# Altium footprint library MYS-Library.PcbLib: 94 footprints (part 2 of 6)
Each footprint in its own frame and in the unit in brackets; x right, y up, seen from the top. Pads: shape width x height; smd on the part's side, far side on the other; paste and mask are expansions set on the pad; w line width, h text height; cw(c..) or ccw(c..) is an arc to the next point about the centre after c.
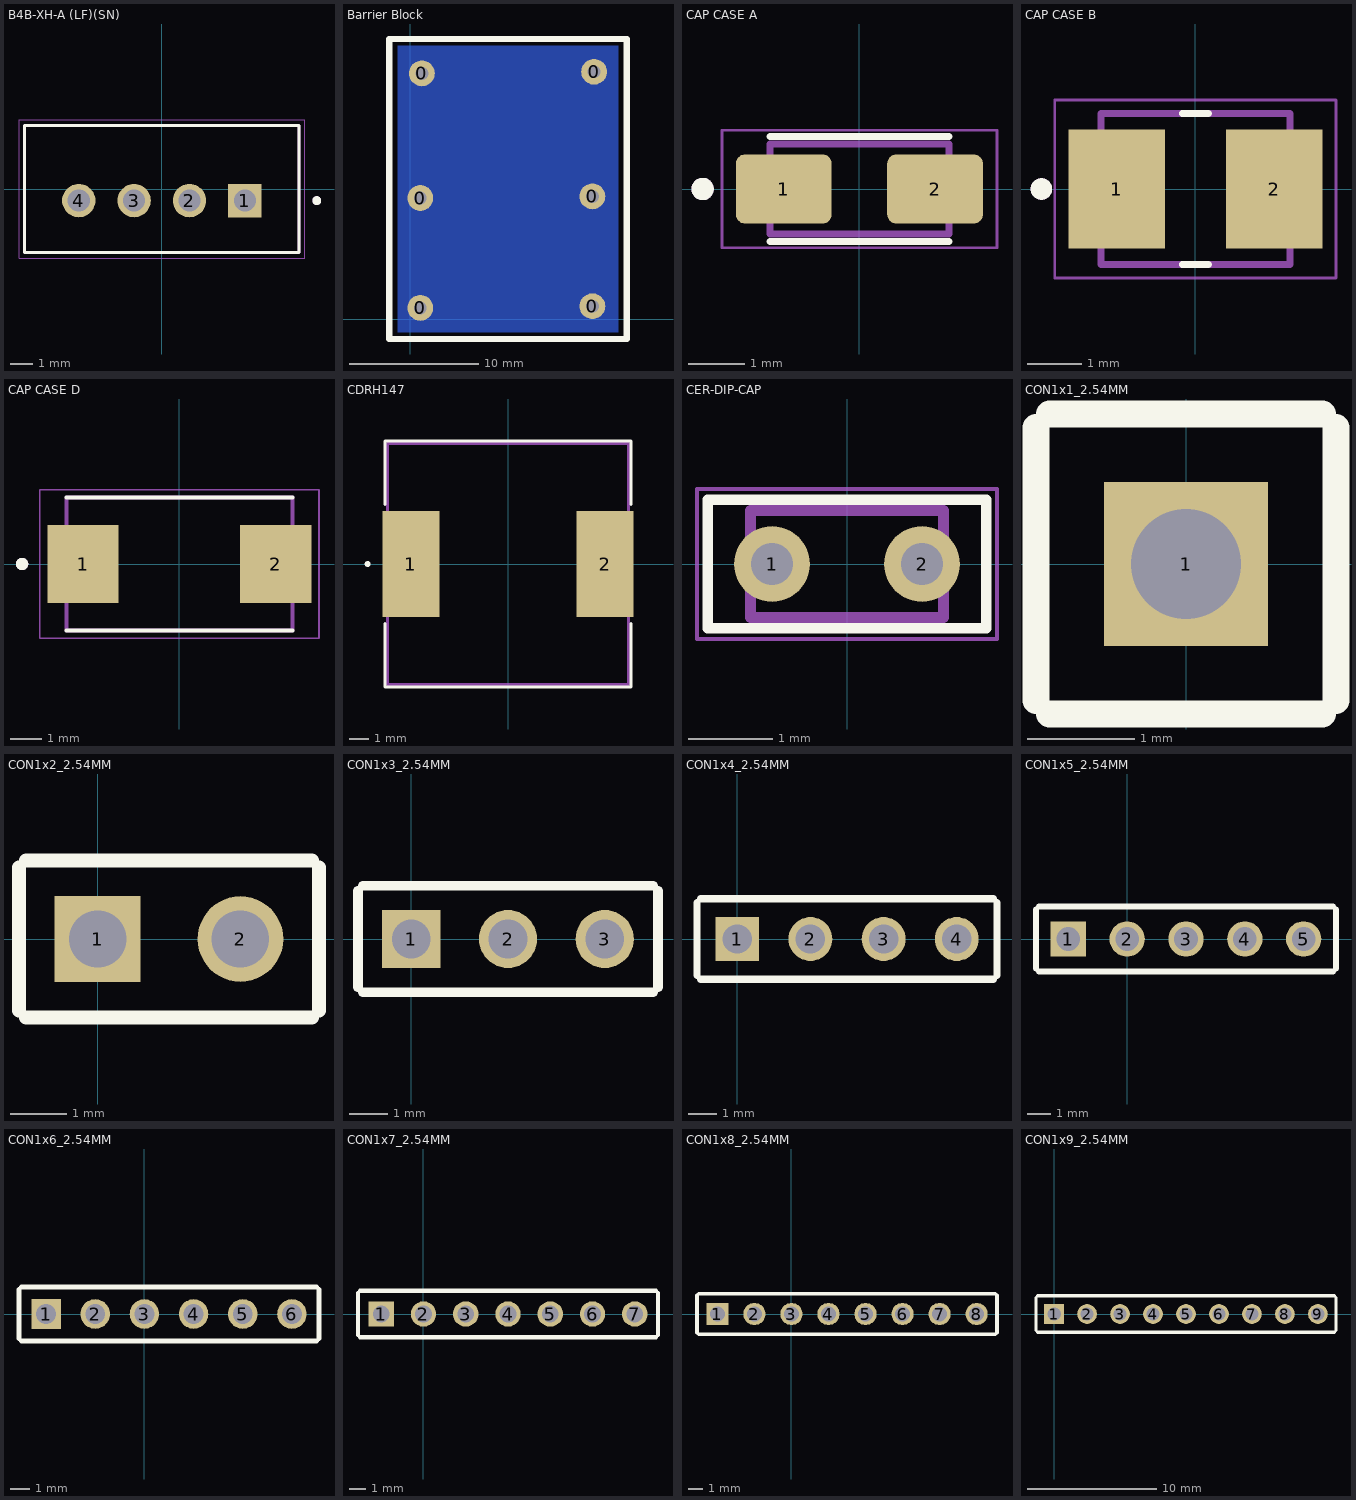
[diagram p1: the footprints below, top view; thin cyan lines are the x and y axes]

## B4B-XH-A (LF)(SN) [mm]
pads (4):
  rect 1.508x1.508 / inner round 1.508 / far side rect 1.508x1.508 hole 1: 1(3.75,-0.525)
  round 1.508 hole 1: 2(1.25,-0.525) 3(-1.25,-0.525) 4(-3.75,-0.525)
Top Overlay:
  circle w0.2: c7,-0.525 r0.1
  lines w0.127: -6.2,-2.875 6.2,-2.875 6.2,2.875 -6.2,2.875 -6.2,-2.875
Mechanical 13:
  circle w0.2: c7,-0.525 r0.1
  lines w0.127: -6.2,-2.875 6.2,-2.875 6.2,2.875 -6.2,2.875 -6.2,-2.875
Mechanical 15:
  lines w0.05: -6.45,-3.125 6.45,-3.125 6.45,3.125 -6.45,3.125 -6.45,-3.125
3D body "step_temp.STEP": height 7, standoff -3.4, extent -6.2,-2.875 6.2,2.875

## Barrier Block [mm]
pads (6):
  round 2 hole 1: 0(0.762,0.889) 0(0.762,9.398) 0(0.889,19.05) 0(14.097,1.016) 0(14.097,9.525) 0(14.224,19.177)
Bottom Layer:
  rectangle: -1.016,-1.016 16.129,21.209
Top Overlay:
  lines w0.5: -1.651,-1.524 16.764,-1.524 16.764,21.717 -1.651,21.717 -1.651,-1.524
3D body: height 11, standoff 0, extent 0,0 15,20
3D body: height 12.27, standoff 11, extent 4.874,7.541 10.874,13.541

## CAP CASE A [mm]
pads (2):
  rrect25% 1.71x1.23 smd: 1(-1.35,0) 2(1.35,0)
Top Overlay:
  circle w0.2: c-2.8,0 r0.1
  lines w0.127: -1.6,-0.935 1.6,-0.935 ; -1.6,0.935 1.6,0.935
Mechanical 13:
  circle w0.2: c-2.8,0 r0.1
  lines w0.127: -1.6,-0.8 -1.6,0.8 1.6,0.8 1.6,-0.8 -1.6,-0.8
Mechanical 15:
  lines w0.05: -2.455,-1.05 -2.455,1.05 2.455,1.05 2.455,-1.05 -2.455,-1.05
3D body "step_temp.STEP": height 1.8, standoff 0, extent -1.6,-0.8 1.6,0.8

## CAP CASE B [mm]
pads (2):
  rect 1.79x2.21 smd: 1(-1.46,0) 2(1.46,0)
Top Overlay:
  circle w0.2: c-2.855,0 r0.1
  lines w0.127: -0.245,-1.4 0.245,-1.4 ; -0.245,1.4 0.245,1.4
Mechanical 13:
  circle w0.2: c-2.855,0 r0.1
  lines w0.127: -1.75,-1.4 1.75,-1.4 1.75,1.4 -1.75,1.4 -1.75,-1.4
Mechanical 15:
  lines w0.05: -2.605,-1.65 2.605,-1.65 2.605,1.65 -2.605,1.65 -2.605,-1.65
3D body "T540B476M006AH6710.STEP": height 2.1, standoff 0, extent -1.75,-1.4 1.75,1.4

## CAP CASE D [mm]
pads (2):
  rect 2.3x2.52 smd: 1(-3.11,0) 2(3.11,0)
Top Overlay:
  circle w0.2: c-5.08,0 r0.1
  lines w0.127: -3.65,-2.15 3.65,-2.15 ; -3.65,2.15 3.65,2.15
Mechanical 13:
  circle w0.2: c-5.08,0 r0.1
  lines w0.127: -3.65,-2.15 3.65,-2.15 3.65,2.15 -3.65,2.15 -3.65,-2.15
Mechanical 15:
  lines w0.05: -4.51,-2.4 4.51,-2.4 4.51,2.4 -4.51,2.4 -4.51,-2.4
3D body "step_temp.STEP": height 3.1, standoff 0, extent -3.65,-2.15 3.65,2.15

## CDRH147 [mil]
pads (2):
  rect 114x213 smd: 1(-195,0) 2(195,0)
Top Overlay:
  lines w6: -247,-120 -247,-247 247,-247 247,-120 ; -247,120 -247,247 247,247 247,120 ; -285,0 ccw(c-282,0) -279,0 ccw(c-282,0) -285,0
Mechanical 13:
  lines w0: -242,0 ccw(c-239,0) -236,0 ccw(c-239,0) -242,0
  lines w6: -242,-242 242,-242 242,242 -242,242 -242,0 -242,-242
3D body "step_temp.STEP": height 314.96, standoff 0, extent -236.22,-236.22 236.22,236.22

## CER-DIP-CAP [mm]
pads (2):
  round 0.9 hole 0.5: 1(-0.889,0) 2(0.889,0)
Top Overlay:
  lines w0.127: -1.651,-0.762 1.651,-0.762 1.651,0.762 -1.651,0.762 -1.651,-0.762
Mechanical 13:
  lines w0.127: -1.143,-0.635 1.143,-0.635 1.143,0.635 -1.143,0.635 -1.143,-0.635
Mechanical 15:
  lines w0.05: -1.778,-0.889 -1.778,0.889 1.778,0.889 1.778,-0.889 -1.778,-0.889
3D body: height 4, standoff 1, extent -1.512,-0.58 1.488,0.57
3D body: height 3, standoff -3, extent -1.089,-0.199 -0.691,0.2
3D body: height 3, standoff -3, extent 0.691,-0.199 1.089,0.2

## CON1x1_2.54MM [mil]
pads (1):
  rect 60x60 hole 40.16: 1(0,0)
Top Overlay:
  lines w10: -55,-50 -55,50 ; -50,-55 50,-55 ; -50,55 50,55 ; 55,-50 55,50
3D body "zl201-1_p2-54_l2-54_w2-54_h8-89.stp": height 350, standoff -120, extent -50,-50 50,50

## CON1x2_2.54MM [mil]
pads (2):
  rect 60x60 hole 40.16: 1(0,0)
  round 60 hole 40.16: 2(100,0)
Top Overlay:
  lines w10: -55,-50 -55,50 ; -50,-55 150,-55 ; -50,55 150,55 ; 155,-50 155,50
3D body "zl201-2_p2-54_l5-08_w2-54_h8-89.stp": height 350, standoff -120, extent -50,-50 150,50

## CON1x3_2.54MM [mil]
pads (3):
  rect 60x60 hole 40.16: 1(0,0)
  round 60 hole 40.16: 2(100,0) 3(200,0)
Top Overlay:
  lines w10: -55,-50 -55,50 ; -50,-55 250,-55 ; -50,55 250,55 ; 255,-50 255,50
3D body "zl201-3_p2-54_l7-62_w2-54_h8-89.stp": height 350, standoff -120, extent -50,-50 250,50

## CON1x4_2.54MM [mil]
pads (4):
  rect 60x60 hole 40.16: 1(0,0)
  round 60 hole 40.16: 2(100,0) 3(200,0) 4(300,0)
Top Overlay:
  lines w10: -55,-50 -55,50 ; -50,-55 350,-55 ; -50,55 350,55 ; 355,-50 355,50
3D body "zl201-4_p2-54_l10-2_w2-54_h8-89.stp": height 350, standoff -120, extent -50,-50 350,50

## CON1x5_2.54MM [mil]
pads (5):
  rect 60x60 hole 40.16: 1(-100,0)
  round 60 hole 40.16: 2(0,0) 3(100,0) 4(200,0) 5(300,0)
Top Overlay:
  lines w10: -155,-50 -155,50 ; -150,-55 350,-55 ; -150,55 350,55 ; 355,-50 355,50
3D body "zl201-5_p2-54_l12-7_w2-54_h8-89.stp": height 350, standoff -120, extent -150,-50 350,50

## CON1x6_2.54MM [mil]
pads (6):
  rect 60x60 hole 40.16: 1(-200,0)
  round 60 hole 40.16: 2(-100,0) 3(0,0) 4(100,0) 5(200,0) 6(300,0)
Top Overlay:
  lines w10: -255,-50 -255,50 ; -250,-55 350,-55 ; -250,55 350,55 ; 355,-50 355,50
3D body "zl201-6_p2-54_l15-2_w2-54_h8-89.stp": height 350, standoff -120, extent -250,-50 350,50

## CON1x7_2.54MM [mil]
pads (7):
  rect 60x60 hole 40.16: 1(-100,0)
  round 60 hole 40.16: 2(0,0) 3(100,0) 4(200,0) 5(300,0) 6(400,0) 7(500,0)
Top Overlay:
  lines w10: -155,-50 -155,50 ; -150,-55 550,-55 ; -150,55 550,55 ; 555,-50 555,50
3D body "zl201-7_p2-54_l17-8_w2-54_h8-89.stp": height 350, standoff -120, extent -150,-50 550,50

## CON1x8_2.54MM [mil]
pads (8):
  rect 60x60 hole 40.16: 1(-200,0)
  round 60 hole 40.16: 2(-100,0) 3(0,0) 4(100,0) 5(200,0) 6(300,0) 7(400,0) 8(500,0)
Top Overlay:
  lines w10: -255,-50 -255,50 ; -250,-55 550,-55 ; -250,55 550,55 ; 555,-50 555,50
3D body "zl201-8_p2-54_l20-3_w2-54_h8-89.stp": height 350, standoff -120, extent -250,-50 550,50

## CON1x9_2.54MM [mil]
pads (9):
  rect 60x60 hole 40.16: 1(0,0)
  round 60 hole 40.16: 2(100,0) 3(200,0) 4(300,0) 5(400,0) 6(500,0) 7(600,0) 8(700,0) 9(800,0)
Top Overlay:
  lines w10: -55,-50 -55,50 ; -50,-55 850,-55 ; -50,55 850,55 ; 855,-50 855,50
3D body "zl201-9_p2-54_l22-9_w2-54_h8-89.stp": height 350, standoff -120, extent -50,-50 850,50